# Altium footprint library lib_datalogger.PcbLib: 866 footprints (part 25 of 55)
Each footprint in its own frame and in the unit in brackets; x right, y up, seen from the top. Pads: shape width x height; smd on the part's side, far side on the other; paste and mask are expansions set on the pad; w line width, h text height; cw(c..) or ccw(c..) is an arc to the next point about the centre after c.
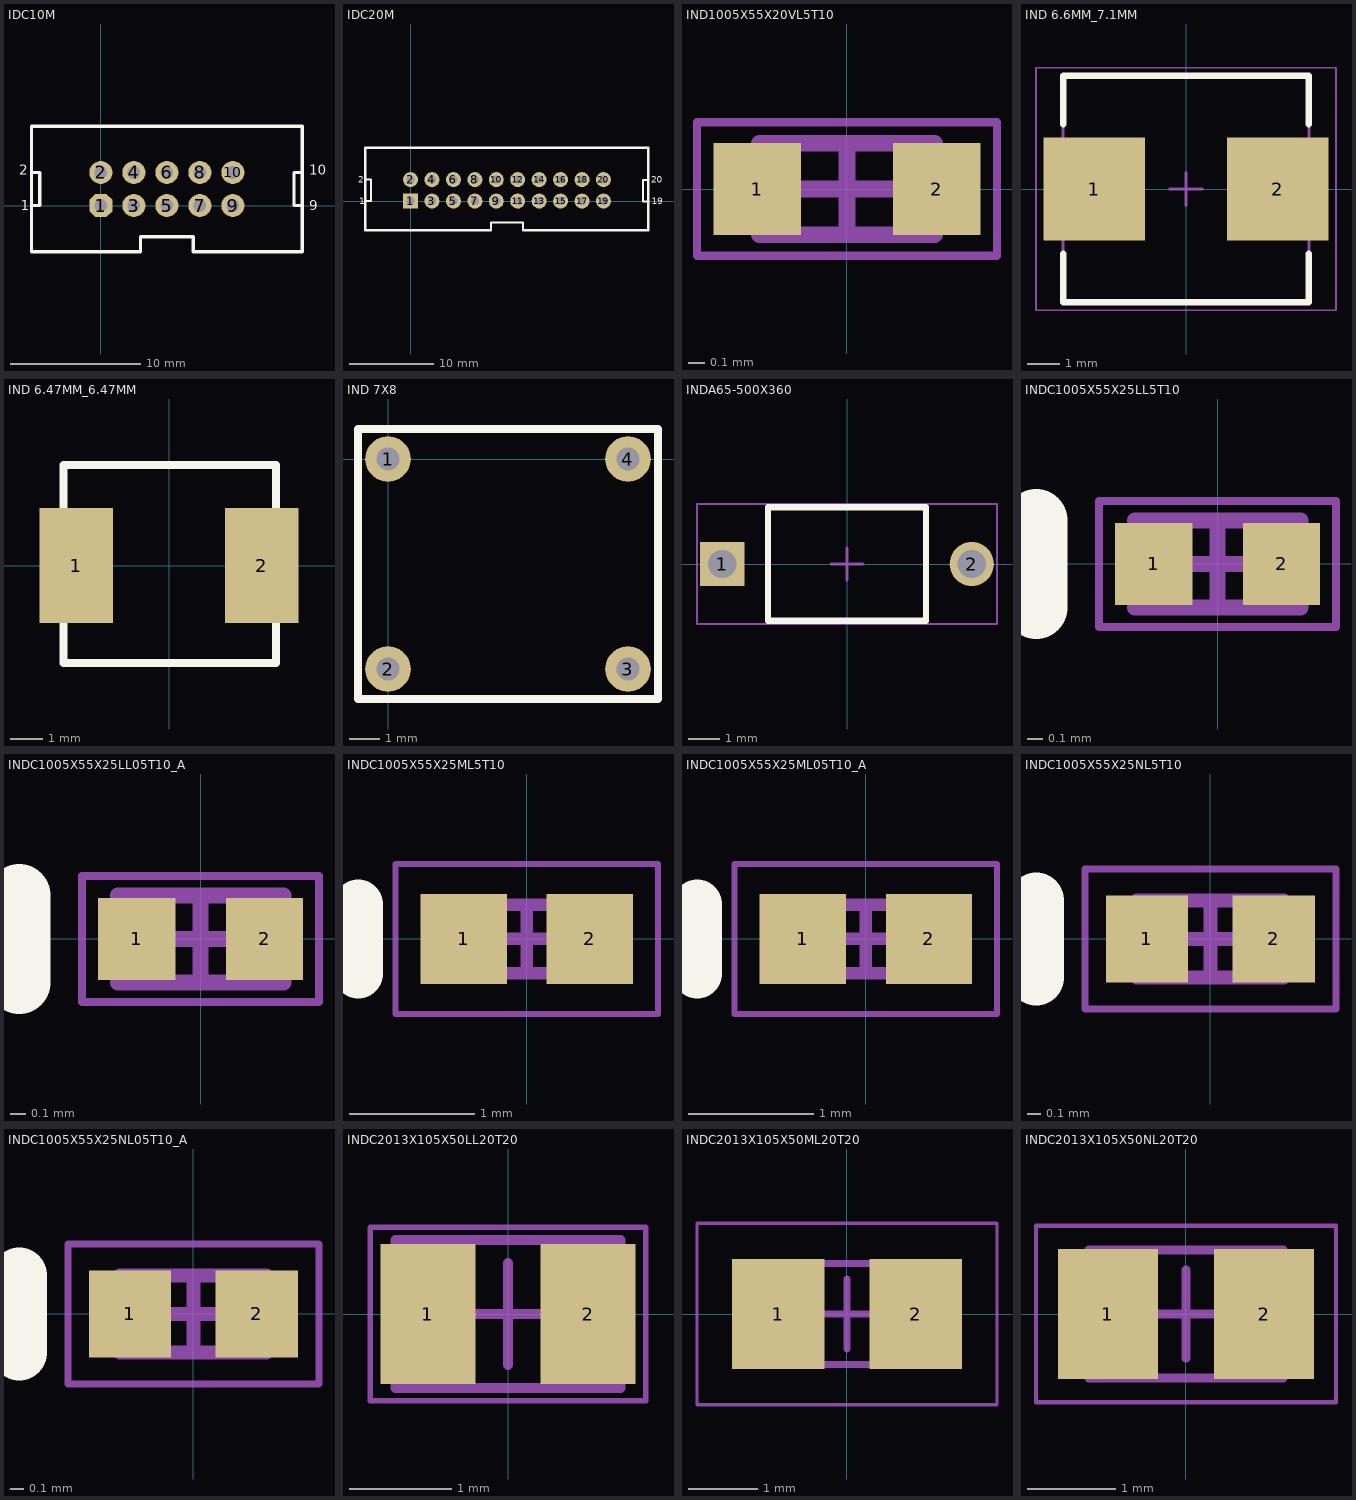
[diagram p24: the footprints below, top view; thin cyan lines are the x and y axes]

## IDC10M [mil]
pads (10):
  oct 70x70 hole 38: 1(0,0)
  round 70 / inner round 60 / far side round 60 hole 38: 2(0,100) 3(100,0) 4(100,100) 5(200,0) 6(200,100) 7(300,0) 8(300,100) 9(400,0) 10(400,100)
Top Overlay:
  lines w10: -210,0 -185,0 -185,100 -210,100 ; 610,0 585,0 585,100 610,100 ; -210,-140 -210,240 610,240 610,-140 280,-140 280,-95 120,-95 120,-140 -210,-140
  text "10" at 631,93 h30
  text "9" at 631,-14.99 h30
  text "2" at -248,93 h30
  text "1" at -243,-15 h30
3D body "idc10.step": height 358.27, standoff -118.11, extent -203.54,-133.07 603.54,233.07

## IDC20M [mil]
pads (20):
  rect 70x70 hole 38: 1(0,0)
  round 70 hole 38: 2(0,100) 3(100,0) 4(100,100) 5(200,0) 6(200,100) 7(300,0) 8(300,100) 9(400,0) 10(400,100) 11(500,0) 12(500,100) 13(600,0) 14(600,100) 15(700,0) 16(700,100) 17(800,0) 18(800,100) 19(900,0) 20(900,100)
Top Overlay:
  lines w10: -210,0 -185,0 -185,100 -210,100 ; 1109,-1 1084,-1 1084,99 1109,99 ; -211,-136 375,-136 375,-100 525,-100 525,-136 1109,-136 1109,249 -211,249 -211,-136
  text "19" at 1124.52,-15 h30
  text "20" at 1122.02,85 h30
  text "1" at -240,-15 h30
  text "2" at -244.99,85 h30
3D body "idc20.step": height 358.27, standoff -118.11, extent -204.54,-127.14 1102.54,239

## IND1005X55X20VL5T10 [mm] "Chip Inductor, 2-Leads, Body 1.05x0.55mm"
height 0.55
pads (2):
  rect 0.525x0.55 smd: 1(-0.537,0) 2(0.537,0)
Mechanical 13:
  lines w0.1: -0.525,-0.275 -0.525,0.275 0.525,0.275 0.525,-0.275 -0.525,-0.275
Mechanical 15:
  lines w0.05: -0.9,-0.4 -0.9,0.4 0.9,0.4 0.9,-0.4 -0.9,-0.4
  lines w0.1: -0.275,0 0.275,0 ; 0,-0.275 0,0.275
3D body "INDC1005X06L.step": height 0.55, standoff 0, extent -0.525,-0.275 0.525,0.275

## IND 6.6MM_7.1MM [mm] "Precision Wire Wound Inductor, 2-Leads, Body 7,10x6,60mm, IPC Medium Density"
height 3
pads (2):
  rect 3.1x3.15 smd: 1(-2.8,0) 2(2.8,0)
Top Overlay:
  lines w0.2: -3.75,-1.975 -3.75,-3.45 3.75,-3.45 3.75,-1.975 ; -3.75,1.975 -3.75,3.45 3.75,3.45 3.75,1.975
Mechanical 13:
  lines w0.1: -3.75,-3.45 -3.75,3.45 3.75,3.45 3.75,-3.45 -3.75,-3.45
Mechanical 15:
  lines w0.05: -4.575,-3.7 -4.575,3.7 4.575,3.7 4.575,-3.7 -4.575,-3.7
  lines w0.1: -0.5,0 0.5,0 ; 0,-0.5 0,0.5
3D body "IND 6.6MM_7.1MM_2.step": height 3.1, standoff 0, extent -3.65,-3.3 3.65,3.3

## IND 6.47MM_6.47MM [mm]
pads (2):
  rect 2.3x3.6 smd: 1(-2.9,0) 2(2.9,0)
Top Overlay:
  lines w0.254: -3.3,-3.05 3.35,-3.05 3.35,3.15 -3.3,3.15 -3.3,-3.05
3D body "User Library-IHLP-2525CZ.STEP": height 3, standoff 0, extent -3.405,-3.185 3.455,3.285

## IND 7X8 [mil]
pads (4):
  round 60 hole 30: 1(0,0) 2(0,-275.59) 3(314.96,-275.59) 4(314.96,0)
Top Overlay:
  lines w10: -39.37,-314.96 354.33,-314.96 354.33,39.37 -39.37,39.37 -39.37,-314.96

## INDA65-500X360 [mm] "Axial Lead, 2-Leads, Dia 3.6mm, Body Length 5mm, Pin Spacing 7.9mm"
height 3.75
pads (2):
  rect 1.4x1.4 hole 0.9: 1(-3.95,0)
  round 1.4 hole 0.9: 2(3.95,0)
Top Overlay:
  lines w0.2: -2.5,-1.8 -2.5,1.8 2.5,1.8 2.5,-1.8 -2.5,-1.8
Mechanical 13:
  lines w0.1: -2.5,-1.8 -2.5,1.8 2.5,1.8 2.5,-1.8 -2.5,-1.8
Mechanical 15:
  lines w0.05: -4.75,-1.9 -4.75,1.9 4.75,1.9 4.75,-1.9 -4.75,-1.9
  lines w0.1: -0.5,0 0.5,0 ; 0,-0.5 0,0.5
3D body: height 1.8, standoff -16.75, extent 3.641,-0.324 4.288,0.325
3D body: height 1.8, standoff -16.75, extent -4.272,-0.324 -3.625,0.325
3D body: height 2.12, standoff 1.47, extent 3.625,-0.322 4.275,0.323
3D body: height 2.12, standoff 1.47, extent -4.275,-0.322 -3.625,0.323
3D body: height 2.12, standoff 1.47, extent -3.937,-0.324 3.963,0.324
3D body: height 3.6, standoff 0, extent -2.5,-1.821 2.5,1.779

## INDC1005X55X25LL5T10 [mm] "Chip Inductor, 2-Leads, Body 1.05x0.55mm, IPC High Density"
height 0.55
pads (2):
  rect 0.49x0.52 smd: 1(-0.405,0) 2(0.405,0)
Top Overlay:
  lines w0.4: -1.15,-0.275 -1.15,0.275
Mechanical 13:
  lines w0.1: -0.525,-0.275 -0.525,0.275 0.525,0.275 0.525,-0.275 -0.525,-0.275
Mechanical 15:
  lines w0.05: -0.75,-0.4 -0.75,0.4 0.75,0.4 0.75,-0.4 -0.75,-0.4
  lines w0.1: -0.275,0 0.275,0 ; 0,-0.275 0,0.275
3D body "INDC1005X06L.step": height 0.55, standoff 0, extent -0.525,-0.275 0.525,0.275

## INDC1005X55X25LL05T10_A [mm] "Chip Inductor, 2-Leads, Body 1.05x0.55mm, IPC High Density"
height 0.55
pads (2):
  rect 0.49x0.52 smd: 1(-0.405,0) 2(0.405,0)
Top Overlay:
  lines w0.4: -1.15,-0.275 -1.15,0.275
Mechanical 13:
  lines w0.1: -0.525,-0.275 0.525,-0.275 0.525,0.275 -0.525,0.275 -0.525,-0.275
Mechanical 15:
  lines w0.05: -0.75,-0.4 0.75,-0.4 0.75,0.4 -0.75,0.4 -0.75,-0.4
  lines w0.1: -0.275,0 0.275,0 ; 0,-0.275 0,0.275
3D body "INDC1005X06L.step": height 0.55, standoff 0, extent -0.525,-0.275 0.525,0.275

## INDC1005X55X25ML5T10 [mm] "Chip Inductor, 2-Leads, Body 1.05x0.55mm, IPC Low Density"
height 0.55
pads (2):
  rect 0.69x0.72 smd: 1(-0.505,0) 2(0.505,0)
Top Overlay:
  lines w0.4: -1.35,-0.275 -1.35,0.275
Mechanical 13:
  lines w0.1: -0.525,-0.275 -0.525,0.275 0.525,0.275 0.525,-0.275 -0.525,-0.275
Mechanical 15:
  lines w0.05: -1.05,-0.6 -1.05,0.6 1.05,0.6 1.05,-0.6 -1.05,-0.6
  lines w0.1: -0.275,0 0.275,0 ; 0,-0.275 0,0.275
3D body "INDC1005X06M.step": height 0.55, standoff 0, extent -0.525,-0.275 0.525,0.275

## INDC1005X55X25ML05T10_A [mm] "Chip Inductor, 2-Leads, Body 1.05x0.55mm, IPC Low Density"
height 0.55
pads (2):
  rect 0.69x0.72 smd: 1(-0.505,0) 2(0.505,0)
Top Overlay:
  lines w0.4: -1.35,-0.275 -1.35,0.275
Mechanical 13:
  lines w0.1: -0.525,-0.275 -0.525,0.275 0.525,0.275 0.525,-0.275 -0.525,-0.275
Mechanical 15:
  lines w0.05: -1.05,-0.6 -1.05,0.6 1.05,0.6 1.05,-0.6 -1.05,-0.6
  lines w0.1: -0.275,0 0.275,0 ; 0,-0.275 0,0.275
3D body "INDC1005X06M.step": height 0.55, standoff 0, extent -0.525,-0.275 0.525,0.275

## INDC1005X55X25NL5T10 [mm] "Chip Inductor, 2-Leads, Body 1.05x0.55mm, IPC Medium Density"
height 0.55
pads (2):
  rect 0.59x0.62 smd: 1(-0.455,0) 2(0.455,0)
Top Overlay:
  lines w0.4: -1.25,-0.275 -1.25,0.275
Mechanical 13:
  lines w0.1: -0.525,-0.275 -0.525,0.275 0.525,0.275 0.525,-0.275 -0.525,-0.275
Mechanical 15:
  lines w0.05: -0.9,-0.5 -0.9,0.5 0.9,0.5 0.9,-0.5 -0.9,-0.5
  lines w0.1: -0.275,0 0.275,0 ; 0,-0.275 0,0.275
3D body "INDC1005X06N.step": height 0.55, standoff 0, extent -0.525,-0.275 0.525,0.275

## INDC1005X55X25NL05T10_A [mm] "Chip Inductor, 2-Leads, Body 1.05x0.55mm, IPC Medium Density"
height 0.55
pads (2):
  rect 0.59x0.62 smd: 1(-0.455,0) 2(0.455,0)
Top Overlay:
  lines w0.4: -1.25,-0.275 -1.25,0.275
Mechanical 13:
  lines w0.1: -0.525,-0.275 0.525,-0.275 0.525,0.275 -0.525,0.275 -0.525,-0.275
Mechanical 15:
  lines w0.05: -0.9,-0.5 0.9,-0.5 0.9,0.5 -0.9,0.5 -0.9,-0.5
  lines w0.1: -0.275,0 0.275,0 ; 0,-0.275 0,0.275
3D body "INDC1005X06N.step": height 0.55, standoff 0, extent -0.525,-0.275 0.525,0.275

## INDC2013X105X50LL20T20 [mm] "Chip Inductor, 2-Leads, Body 2.2x1.45mm, IPC High Density"
height 1.05
pads (2):
  rect 0.93x1.37 smd: 1(-0.785,0) 2(0.785,0)
Mechanical 13:
  lines w0.1: -1.1,-0.725 1.1,-0.725 1.1,0.725 -1.1,0.725 -1.1,-0.725
Mechanical 15:
  lines w0.05: -1.35,-0.85 1.35,-0.85 1.35,0.85 -1.35,0.85 -1.35,-0.85
  lines w0.1: -0.5,0 0.5,0 ; 0,-0.5 0,0.5
3D body "INDC2013X11L.step": height 1.05, standoff 0, extent -1.1,-0.725 1.1,0.725

## INDC2013X105X50ML20T20 [mm] "Chip Inductor, 2-Leads, Body 2.2x1.45mm, IPC Low Density"
height 1.05
pads (2):
  rect 1.33x1.57 smd: 1(-0.985,0) 2(0.985,0)
Mechanical 13:
  lines w0.1: -1.1,-0.725 1.1,-0.725 1.1,0.725 -1.1,0.725 -1.1,-0.725
Mechanical 15:
  lines w0.05: -2.15,-1.3 2.15,-1.3 2.15,1.3 -2.15,1.3 -2.15,-1.3
  lines w0.1: -0.5,0 0.5,0 ; 0,-0.5 0,0.5
3D body "INDC2013X11M.step": height 1.05, standoff 0, extent -1.1,-0.725 1.1,0.725

## INDC2013X105X50NL20T20 [mm] "Chip Inductor, 2-Leads, Body 2.2x1.45mm, IPC Medium Density"
height 1.05
pads (2):
  rect 1.13x1.47 smd: 1(-0.885,0) 2(0.885,0)
Mechanical 13:
  lines w0.1: -1.1,-0.725 1.1,-0.725 1.1,0.725 -1.1,0.725 -1.1,-0.725
Mechanical 15:
  lines w0.05: -1.7,-1 1.7,-1 1.7,1 -1.7,1 -1.7,-1
  lines w0.1: -0.5,0 0.5,0 ; 0,-0.5 0,0.5
3D body "INDC2013X11N.step": height 1.05, standoff 0, extent -1.1,-0.725 1.1,0.725